# Altium footprint library microbuilder.PCBLIB: 422 footprints (part 12 of 27)
Each footprint in its own frame and in the unit in brackets; x right, y up, seen from the top. Pads: shape width x height; smd on the part's side, far side on the other; paste and mask are expansions set on the pad; w line width, h text height; cw(c..) or ccw(c..) is an arc to the next point about the centre after c.
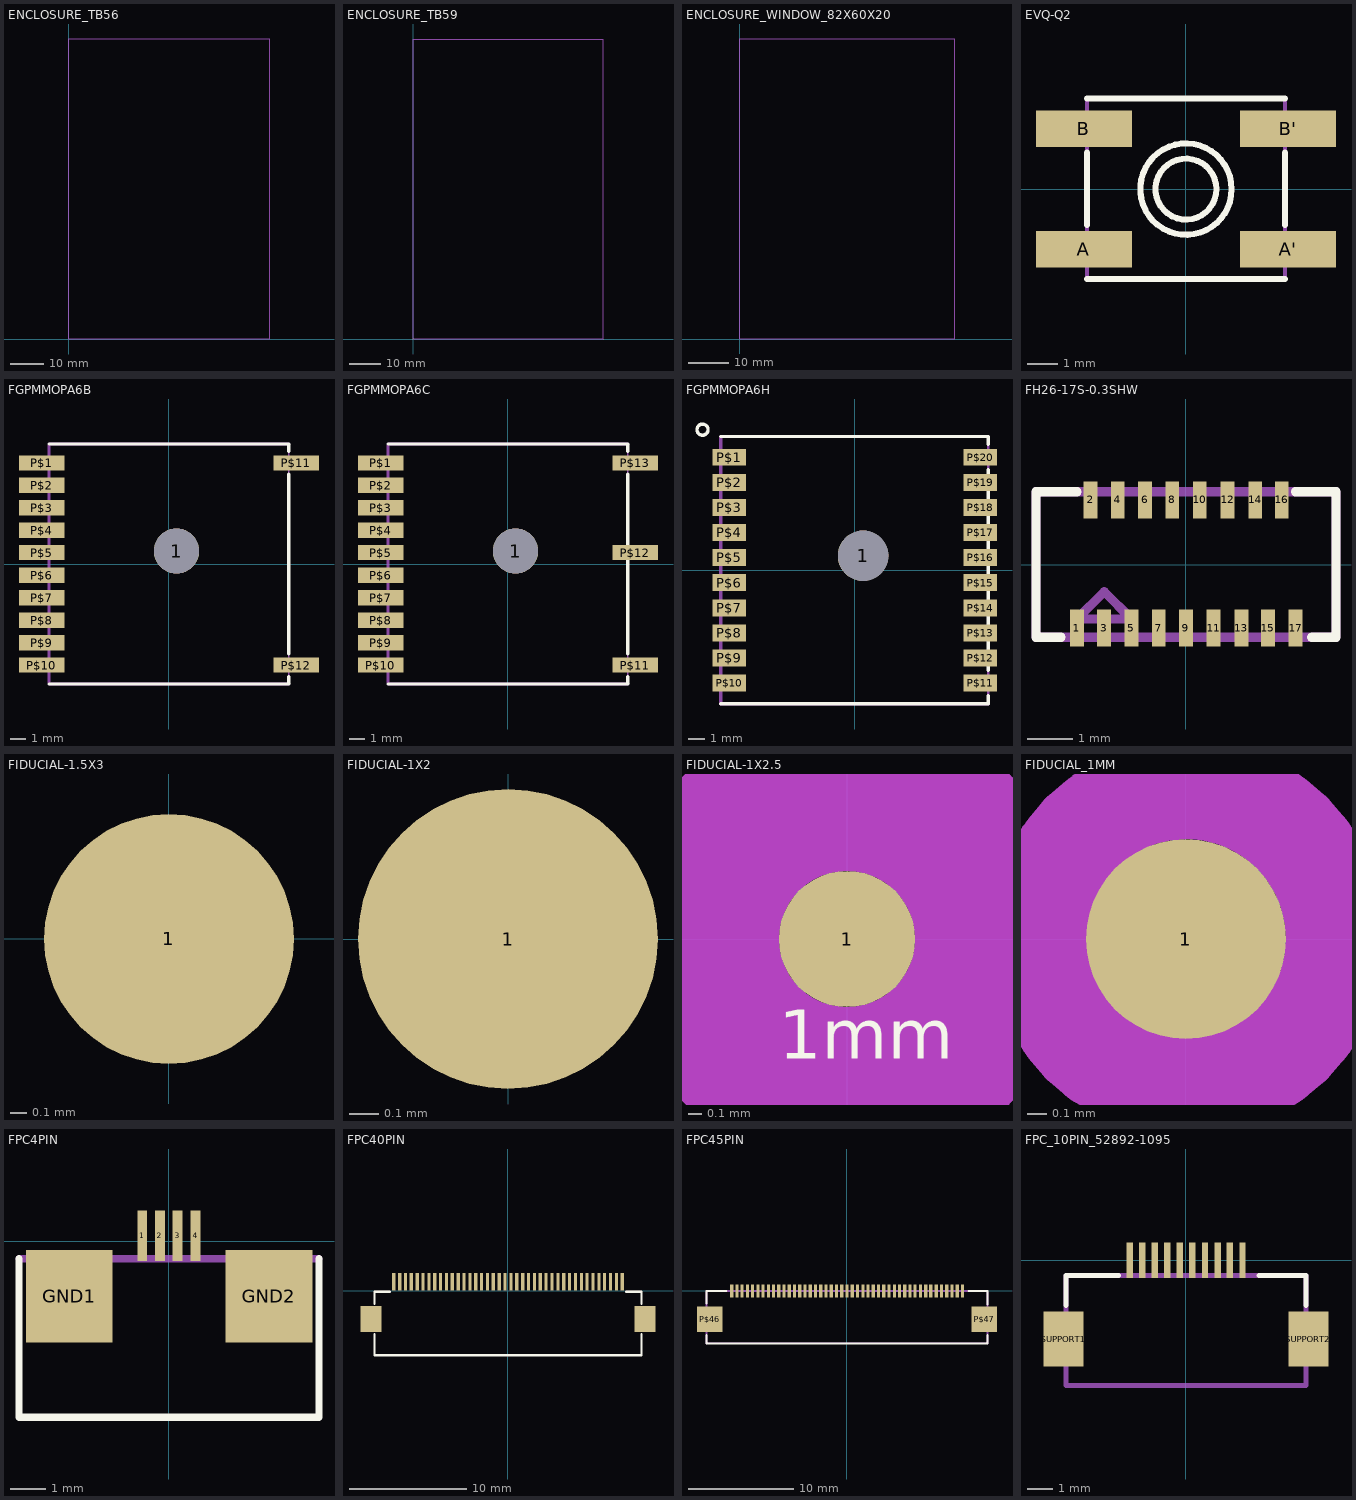
[diagram p11: the footprints below, top view; thin cyan lines are the x and y axes]

## ENCLOSURE_TB56 [mil]
Mechanical 1:
  lines w0: 0,0 2363,0 2363,3544 0,3544 0,0

## ENCLOSURE_TB59 [mil]
Mechanical 1:
  lines w0: 0,0 2363,0 2363,3741 0,3741 0,0

## ENCLOSURE_WINDOW_82X60X20 [mil]
Mechanical 1:
  lines w0: 0,0 2087,0 2087,2914 0,2914 0,0

## EVQ-Q2 [mil]
pads (4):
  rect 126x48 smd: A(-133.86,-78.74) A'(134,-78.74) B(-133.86,79) B'(134,79)
Top Overlay:
  circle w8: c0,0 r60
  circle w8: c0,0 r40
  lines w8: -129.92,-118.11 130,-118.11 ; -129.92,-47.24 -129.92,48 ; -129.92,119 130,119 ; 130,-47.24 130,48
Mechanical 16:
  lines w5: -129.92,-118.11 -129.92,119 ; 130,-118.11 130,119

## FGPMMOPA6B [mil]
pads (13):
  round 119 hole 119: 1(20,34)
  rect 119x40 smd: P$1(-334.65,266) P$2(-334.65,207) P$3(-334.65,148) P$4(-334.65,89) P$5(-334.65,30) P$6(-334.65,-29.53) P$7(-334.65,-88.58) P$8(-334.65,-147.64) P$9(-334.65,-206.69) P$10(-334.65,-265.75) P$11(335,266) P$12(335,-265.75)
Top Overlay:
  lines w8: -314.96,-314.96 315,-314.96 315,-295.28 ; -314.96,315 315,315 315,296 ; 315,-236.22 315,237
Mechanical 16:
  circle w32: c20,34 r20
  lines w5: 315,-314.96 315,315
  lines w8: 315,-314.96 -314.96,-314.96 -314.96,315 315,315

## FGPMMOPA6C [mil]
pads (14):
  round 119 hole 119: 1(20,34)
  rect 119x40 smd: P$1(-334.65,266) P$2(-334.65,207) P$3(-334.65,148) P$4(-334.65,89) P$5(-334.65,30) P$6(-334.65,-29.53) P$7(-334.65,-88.58) P$8(-334.65,-147.64) P$9(-334.65,-206.69) P$10(-334.65,-265.75) P$11(335,-265.75) P$12(335,30) P$13(335,266)
Top Overlay:
  lines w8: -314.96,-314.96 315,-314.96 315,-295.28 ; -314.96,315 315,315 315,296 ; 315,-236.22 315,237
Mechanical 16:
  circle w32: c20,34 r20
  lines w5: 315,-314.96 315,315
  lines w8: 315,-314.96 -314.96,-314.96 -314.96,315 315,315

## FGPMMOPA6H [mil]
pads (21):
  round 119 hole 119: 1(20,34)
  rect 79x40 smd: P$1(-295.28,266) P$2(-295.28,207) P$3(-295.28,148) P$4(-295.28,89) P$5(-295.28,30) P$6(-295.28,-29.53) P$7(-295.28,-88.58) P$8(-295.28,-147.64) P$9(-295.28,-206.69) P$10(-295.28,-265.75) P$11(296,-265.75) P$12(296,-206.69) P$13(296,-147.64) P$14(296,-88.58) P$15(296,-29.53) P$16(296,30) P$17(296,89) P$18(296,148) P$19(296,207) P$20(296,266)
Top Overlay:
  circle w8: c-358.27,331 r13
  lines w8: -314.96,-314.96 315,-314.96 315,-295.28 ; -314.96,315 315,315 315,296 ; 315,-236.22 315,237
Mechanical 16:
  circle w32: c20,34 r20
  lines w5: 315,-314.96 315,315
  lines w8: 315,-314.96 -314.96,-314.96 -314.96,315 315,315

## FH26-17S-0.3SHW [mil]
pads (17):
  rect 12x32 smd: 1(-94.49,-55.12) 2(-82.68,56) 3(-70.87,-55.12) 4(-59.06,56) 5(-47.24,-55.12) 6(-35.43,56) 7(-23.62,-55.12) 8(-11.81,56) 9(0,-55.12) 10(12,56) 11(24,-55.12) 12(36,56) 13(48,-55.12) 14(60,56) 15(71,-55.12) 16(83,56) 17(95,-55.12)
Top Overlay:
  lines w8: -108.27,-62.99 -129.92,-62.99 -129.92,63 -94.49,63 ; 95,63 130,63 130,-62.99 109,-62.99
Mechanical 16:
  lines w8: -129.92,-62.99 130,-62.99 130,63 -129.92,63 -129.92,-62.99 ; -94.49,-47.24 -47.24,-47.24 -70.87,-23.62 -94.49,-47.24
  text "HRS" at -37.8,-44.49 h37.2

## FIDUCIAL-1.5X3 [mil]
pads (1):
  rrect100% 60x60 smd: 1(0,0)
Top Solder:
  circle w50: c0,0 r36
  circle w50: c0,0 r36

## FIDUCIAL-1X2 [mil]
pads (1):
  rrect100% 40x40 smd: 1(0,0)

## FIDUCIAL-1X2.5 [mil]
pads (1):
  rrect100% 40x40 smd: 1(0,0)
Top Layer keep-out:
  circle w48: c0,0 r44
Top Overlay:
  text "1mm" at -20,-40 h24.8
Top Solder:
  circle w48: c0,0 r44
Mechanical 27:
  circle w48: c0,0 r44

## FIDUCIAL_1MM [mil]
pads (1):
  rrect100% 40x40 smd: 1(0,0)
Top Layer keep-out:
  lines w20: -29.53,0 cw(c0.24,0.24) 0,30 cw(c0,0) 30,0 cw(c0.24,0.24) 0,-29.53 cw(c0,0) -29.53,0
Top Solder:
  lines w20: -29.53,0 cw(c0.24,0.24) 0,30 cw(c0,0) 30,0 cw(c0.24,0.24) 0,-29.53 cw(c0,0) -29.53,0
Mechanical 27:
  lines w20: -29.53,0 cw(c0.24,0.24) 0,30 cw(c0,0) 30,0 cw(c0.24,0.24) 0,-29.53 cw(c0,0) -29.53,0

## FPC4PIN [mil]
pads (6):
  rect 11x56 smd: 1(-29.53,6) 2(-9.84,6) 3(10,6) 4(30,6)
  rect 97x103 smd: GND1(-111.22,-61.61) GND2(112,-61.61)
Top Overlay:
  lines w8: -167.32,-177.17 -167.32,-196.85 150,-196.85 ; -167.32,-175.2 -167.32,-19.68 ; 152,-196.85 168,-196.85 168,-181.1 ; 168,-179.13 168,-19.68
Mechanical 16:
  lines w5: -167.32,-19.68 -167.32,-196.85 168,-196.85 168,-19.68
  lines w8: -167.32,-19.68 168,-19.68

## FPC40PIN [mil]
pads (42):
  rect 11x60 smd: P$1(-383.86,30) P$2(-364.17,30) P$3(-344.49,30) P$4(-324.8,30) P$5(-305.12,30) P$6(-285.43,30) P$7(-265.75,30) P$8(-246.06,30) P$9(-226.38,30) P$10(-206.69,30) P$11(-187.01,30) P$12(-167.32,30) P$13(-147.64,30) P$14(-127.95,30) P$15(-108.27,30) P$16(-88.58,30) P$17(-68.9,30) P$18(-49.21,30) P$19(-29.53,30) P$20(-9.84,30) P$21(10,30) P$22(30,30) P$23(50,30) P$24(69,30) P$25(89,30) P$26(109,30) P$27(128,30) P$28(148,30) P$29(168,30) P$30(188,30) P$31(207,30) P$32(227,30) P$33(247,30) P$34(266,30) P$35(286,30) P$36(306,30) P$37(325,30) P$38(345,30) P$39(365,30) P$40(384,30)
  rect 71x87 smd: SUPPORT1(-460.63,-94.49) SUPPORT2(461,-94.49)
Top Overlay:
  lines w8: -448.82,-145.67 -448.82,-216.54 449,-216.54 449,-145.67 ; -448.82,-43.31 -448.82,-3.94 -397.64,-3.94 ; 398,-3.94 449,-3.94 449,-43.31

## FPC45PIN [mil]
pads (47):
  rect 12x48 smd: P$1(-433.07,0) P$2(-413.39,0) P$3(-393.7,0) P$4(-374.02,0) P$5(-354.33,0) P$6(-334.65,0) P$7(-314.96,0) P$8(-295.28,0) P$9(-275.59,0) P$10(-255.91,0) P$11(-236.22,0) P$12(-216.54,0) P$13(-196.85,0) P$14(-177.17,0) P$15(-157.48,0) P$16(-137.8,0) P$17(-118.11,0) P$18(-98.43,0) P$19(-78.74,0) P$20(-59.06,0) P$21(-39.37,0) P$22(-19.68,0) P$23(0,0) P$24(20,0) P$25(40,0) P$26(60,0) P$27(79,0) P$28(99,0) P$29(119,0) P$30(138,0) P$31(158,0) P$32(178,0) P$33(197,0) P$34(217,0) P$35(237,0) P$36(256,0) P$37(276,0) P$38(296,0) P$39(315,0) P$40(335,0) P$41(355,0) P$42(375,0) P$43(394,0) P$44(414,0) P$45(434,0)
  rect 95x95 smd: P$46(-515.75,-106.3) P$47(516,-106.3)
Top Overlay:
  lines w8: -527.56,-165.35 -527.56,-196.85 528,-196.85 528,-165.35 ; -527.56,-47.24 -527.56,0 -452.76,0 ; 457,0 528,0 528,-51.18
Mechanical 16:
  lines w5: -527.56,-196.85 528,-196.85
  lines w8: -527.56,-196.85 -527.56,0 528,0 528,-196.85

## FPC_10PIN_52892-1095 [mil]
pads (12):
  rect 10x56 smd: P$1(-88.58,0) P$2(-68.9,0) P$3(-49.21,0) P$4(-29.53,0) P$5(-9.84,0) P$6(10,0) P$7(30,0) P$8(50,0) P$9(69,0) P$10(89,0)
  rect 63x87 smd: SUPPORT1(-192.91,-124.02) SUPPORT2(193,-124.02)
Top Overlay:
  lines w8: -188.98,-70.87 -188.98,-23.62 -106.3,-23.62 ; 115,-23.62 189,-23.62 189,-70.87
Mechanical 16:
  lines w8: -188.98,-196.85 189,-196.85 189,-23.62 -188.98,-23.62 -188.98,-196.85